# Altium footprint library SG__PCB_HOLE_Connector.PcbLib: 154 footprints (part 8 of 10)
Each footprint in its own frame and in the unit in brackets; x right, y up, seen from the top. Pads: shape width x height; smd on the part's side, far side on the other; paste and mask are expansions set on the pad; w line width, h text height; cw(c..) or ccw(c..) is an arc to the next point about the centre after c.
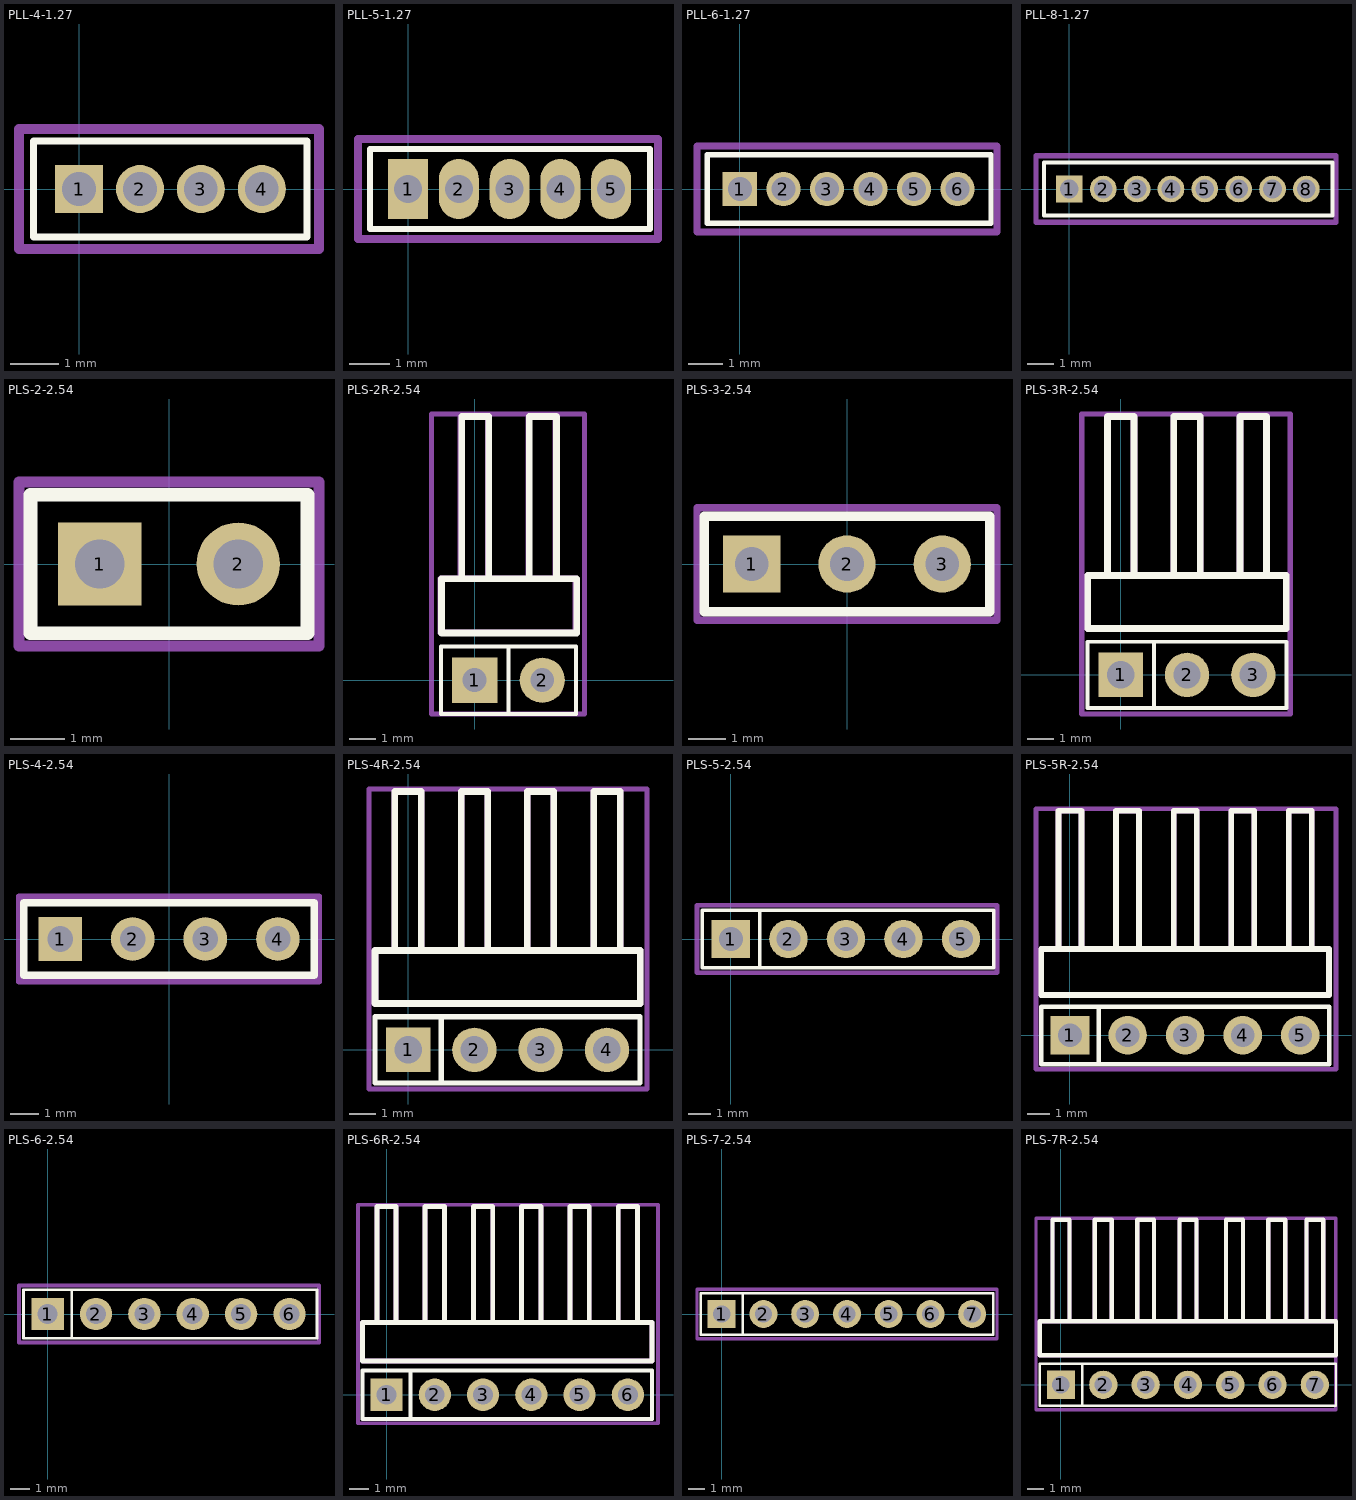
[diagram p7: the footprints below, top view; thin cyan lines are the x and y axes]

## PLL-4-1.27 [mm]
pads (4):
  rect 1x1 hole 0.7 mask+0.05: 1(0,0)
  round 1 hole 0.7 mask+0.05: 2(1.27,0) 3(2.54,0) 4(3.81,0)
Top Overlay:
  lines w0.15: -0.95,-1 4.75,-1 4.75,1 -0.95,1 -0.95,-1
Top Courtyard:
  lines w0.2: -1.25,-1.25 -1.25,1.25 5,1.25 5,-1.25 -1.25,-1.25

## PLL-5-1.27 [mm]
pads (5):
  rect 1x1.5 hole 0.7 mask+0.05: 1(0,0)
  oval 1x1.5 hole 0.7 mask+0.05: 2(1.27,0) 3(2.54,0) 4(3.81,0) 5(5.08,0)
Top Overlay:
  lines w0.15: -0.95,-1 -0.95,1 6.05,1 6.05,-1 -0.95,-1
Top Courtyard:
  lines w0.2: -1.25,-1.25 -1.25,1.25 6.25,1.25 6.25,-1.25 -1.25,-1.25

## PLL-6-1.27 [mm]
pads (6):
  rect 1x1 hole 0.7 mask+0.05: 1(0,0)
  round 1 hole 0.7 mask+0.05: 2(1.27,0) 3(2.54,0) 4(3.81,0) 5(5.08,0) 6(6.35,0)
Top Overlay:
  lines w0.15: -0.95,-1 7.32,-1 7.32,1 -0.95,1 -0.95,-1
Top Courtyard:
  lines w0.2: -1.25,-1.25 -1.25,1.25 7.5,1.25 7.5,-1.25 -1.25,-1.25

## PLL-8-1.27 [mm]
pads (8):
  rect 1x1 hole 0.7 mask+0.05: 1(0,0)
  round 1 hole 0.7 mask+0.05: 2(1.27,0) 3(2.54,0) 4(3.81,0) 5(5.08,0) 6(6.35,0) 7(7.62,0) 8(8.89,0)
Top Overlay:
  lines w0.15: -0.95,-1 9.86,-1 9.86,1 -0.95,1 -0.95,-1
Top Courtyard:
  lines w0.2: -1.25,-1.25 10,-1.25 10,1.25 -1.25,1.25 -1.25,-1.25

## PLS-2-2.54 [mil]
height 472.44
pads (2):
  rect 60x60 hole 35.43: 1(-50,0)
  round 60 hole 35.43: 2(50,0)
Top Overlay:
  lines w10: -100,-50 -100,50 100,50 100,-50 -100,-50
Top Courtyard:
  lines w7.87: -108.27,-59.06 -108.27,59.06 108.27,59.06 108.27,-59.06 -108.27,-59.06
3D body "PLS1.stp": height 336.22, standoff -118.11, extent -100,-50 0,50
3D body "PLS1.stp": height 336.22, standoff -118.11, extent 0,-50 100,50

## PLS-2R-2.54 [mm]
pads (2):
  rect 1.7x1.7 hole 0.9 mask+0.05: 1(0,0)
  round 1.7 hole 0.9 mask+0.05: 2(2.54,0)
Top Overlay:
  lines w0.15: 1.27,-1.27 1.27,1.27 ; -1.27,-1.27 -1.27,1.27 3.81,1.27 3.81,-1.27 -1.27,-1.27
  lines w0.254: -0.485,3.807 -0.485,9.903 0.531,9.903 0.531,3.807 ; 2.055,3.807 2.055,9.903 3.071,9.903 3.071,3.807 ; -1.247,1.775 3.833,1.775 3.833,3.807 -1.247,3.807 -1.247,1.775
Top Assembly:
  lines w0.254: -0.508,3.81 -0.508,9.906 0.508,9.906 0.508,3.81 ; 2.032,3.81 2.032,9.906 3.048,9.906 3.048,3.81 ; -1.27,1.778 3.81,1.778 3.81,3.81 -1.27,3.81 -1.27,1.778
Top Courtyard:
  lines w0.2: -1.619,-1.27 4.124,-1.27 4.124,10 -1.619,10 -1.619,-1.27
3D body "PLS-1R_D1.STEP": height 3, standoff -2.5, extent 1.27,-0.32 3.81,10.04
3D body "PLS-1R_D1.STEP": height 3, standoff -2.5, extent -1.27,-0.354 1.27,10.006

## PLS-3-2.54 [mil]
pads (3):
  rect 60x60 hole 35.43: 1(-100,0)
  round 60 hole 35.43: 2(0,0) 3(100,0)
Top Overlay:
  lines w10: -150,-50 -150,50 150,50 150,-50 -150,-50
Top Courtyard:
  lines w7.87: -157.48,-59.06 -157.48,59.06 157.48,59.06 157.48,-59.06 -157.48,-59.06
3D body "PLS1.stp": height 336.22, standoff -118.11, extent -150,-50 -50,50
3D body "PLS1.stp": height 336.22, standoff -118.11, extent -50,-50 50,50
3D body "PLS1.stp": height 336.22, standoff -118.11, extent 50,-50 150,50

## PLS-3R-2.54 [mm]
pads (3):
  rect 1.7x1.7 hole 1.05 mask+0.05: 1(0,0)
  round 1.7 hole 1.05 mask+0.05: 2(2.54,0) 3(5.08,0)
Top Overlay:
  lines w0.15: 1.27,-1.27 1.27,1.27 ; -1.27,-1.27 6.35,-1.27 6.35,1.27 -1.27,1.27 -1.27,-1.27
  lines w0.254: -0.508,3.81 -0.508,9.906 0.508,9.906 0.508,3.81 ; 2.032,3.81 2.032,9.906 3.048,9.906 3.048,3.81 ; 4.572,3.81 4.572,9.906 5.588,9.906 5.588,3.81 ; -1.27,1.778 -1.27,3.81 6.35,3.81 6.35,1.778 -1.27,1.778
Top Assembly:
  lines w0.254: -0.508,3.81 -0.508,9.906 0.508,9.906 0.508,3.81 ; 2.032,3.81 2.032,9.906 3.048,9.906 3.048,3.81 ; 4.572,3.81 4.572,9.906 5.588,9.906 5.588,3.81 ; -1.27,1.778 -1.27,3.81 6.35,3.81 6.35,1.778 -1.27,1.778
Top Courtyard:
  lines w0.2: -1.5,-1.5 6.5,-1.5 6.5,10 -1.5,10 -1.5,-1.5
3D body "PLS-1R_D1.STEP": height 3, standoff -2.5, extent -1.27,-0.354 1.27,10.006
3D body "PLS-1R_D1.STEP": height 3, standoff -2.5, extent 1.27,-0.32 3.81,10.04
3D body "PLS-1R_D1.STEP": height 3, standoff -2.5, extent 3.81,-0.32 6.35,10.04

## PLS-4-2.54 [mil]
pads (4):
  rect 60x60 hole 35.43: 1(-150,0)
  round 60 hole 35.43: 2(-50,0) 3(50,0) 4(150,0)
Top Overlay:
  lines w10: -200,-50 200,-50 200,50 -200,50 -200,-50
Top Courtyard:
  lines w7.87: -206.69,-59.06 -206.69,59.06 206.69,59.06 206.69,-59.06 -206.69,-59.06
3D body "PLS1.stp": height 336.22, standoff -118.11, extent 100,-50 200,50
3D body "PLS1.stp": height 336.22, standoff -118.11, extent 0,-50 100,50
3D body "PLS1.stp": height 336.22, standoff -118.11, extent -100,-50 0,50
3D body "PLS1.stp": height 336.22, standoff -118.11, extent -200,-50 -100,50

## PLS-4R-2.54 [mm]
pads (4):
  rect 1.7x1.7 hole 1.05 mask+0.05: 1(0,0)
  round 1.7 hole 1.05 mask+0.05: 2(2.54,0) 3(5.08,0) 4(7.62,0)
Top Overlay:
  lines w0.2: 1.27,-1.27 1.27,1.27 ; -1.27,-1.27 -1.27,1.27 8.89,1.27 8.89,-1.27 -1.27,-1.27
  lines w0.254: -0.508,3.81 -0.508,9.906 0.508,9.906 0.508,3.81 ; 2.032,3.81 2.032,9.906 3.048,9.906 3.048,3.81 ; 4.572,3.81 4.572,9.906 5.588,9.906 5.588,3.81 ; 7.112,3.81 7.112,9.906 8.128,9.906 8.128,3.81 ; -1.27,1.778 -1.27,3.81 8.89,3.81 8.89,1.778 -1.27,1.778
Top Assembly:
  lines w0.254: -0.508,3.81 -0.508,9.906 0.508,9.906 0.508,3.81 ; 2.032,3.81 2.032,9.906 3.048,9.906 3.048,3.81 ; 4.572,3.81 4.572,9.906 5.588,9.906 5.588,3.81 ; 7.112,3.81 7.112,9.906 8.128,9.906 8.128,3.81 ; -1.27,1.778 -1.27,3.81 8.89,3.81 8.89,1.778 -1.27,1.778
Top Courtyard:
  lines w0.2: -1.5,-1.5 -1.5,10 9.154,10 9.154,-1.5 -1.5,-1.5
3D body "PLS-1R_D1.STEP": height 3, standoff -2.5, extent 6.35,-0.32 8.89,10.04
3D body "PLS-1R_D1.STEP": height 3, standoff -2.5, extent 3.81,-0.32 6.35,10.04
3D body "PLS-1R_D1.STEP": height 3, standoff -2.5, extent 1.27,-0.32 3.81,10.04
3D body "PLS-1R_D1.STEP": height 3, standoff -2.5, extent -1.27,-0.354 1.27,10.006

## PLS-5-2.54 [mm]
pads (5):
  rect 1.7x1.7 hole 1.05 mask+0.05: 1(0,0)
  round 1.7 hole 1.05 mask+0.05: 2(2.54,0) 3(5.08,0) 4(7.62,0) 5(10.16,0)
Top Overlay:
  lines w0.15: 1.27,-1.27 1.27,1.27 ; -1.27,-1.27 11.6,-1.27 11.6,1.27 -1.27,1.27 -1.27,-1.27
Top Courtyard:
  lines w0.2: -1.5,-1.5 -1.5,1.5 11.75,1.5 11.75,-1.5 -1.5,-1.5
3D body "PLS1.stp": height 8.54, standoff -3, extent -1.27,-1.27 1.27,1.27
3D body "PLS1.stp": height 8.54, standoff -3, extent 1.27,-1.27 3.81,1.27
3D body "PLS1.stp": height 8.54, standoff -3, extent 3.81,-1.27 6.35,1.27
3D body "PLS1.stp": height 8.54, standoff -3, extent 6.35,-1.27 8.89,1.27
3D body "PLS1.stp": height 8.54, standoff -3, extent 8.89,-1.27 11.43,1.27

## PLS-5R-2.54 [mm]
pads (5):
  rect 1.7x1.7 hole 1.05 mask+0.05: 1(0,0)
  round 1.7 hole 1.05 mask+0.05: 2(2.54,0) 3(5.08,0) 4(7.62,0) 5(10.16,0)
Top Overlay:
  lines w0.2: 1.27,-1.27 1.27,1.27 ; -1.27,-1.27 -1.27,1.27 11.43,1.27 11.43,-1.27 -1.27,-1.27
  lines w0.254: -0.508,3.81 -0.508,9.906 0.508,9.906 0.508,3.81 ; 2.032,3.81 2.032,9.906 3.048,9.906 3.048,3.81 ; 4.572,3.81 4.572,9.906 5.588,9.906 5.588,3.81 ; 7.112,3.81 7.112,9.906 8.128,9.906 8.128,3.81 ; 9.652,3.81 9.652,9.906 10.668,9.906 10.668,3.81 ; -1.27,1.778 -1.27,3.81 11.43,3.81 11.43,1.778 -1.27,1.778
Top Assembly:
  lines w0.254: -0.508,3.81 -0.508,9.906 0.508,9.906 0.508,3.81 ; 2.032,3.81 2.032,9.906 3.048,9.906 3.048,3.81 ; 4.572,3.81 4.572,9.906 5.588,9.906 5.588,3.81 ; 7.112,3.81 7.112,9.906 8.128,9.906 8.128,3.81 ; 9.652,3.81 9.652,9.906 10.668,9.906 10.668,3.81 ; -1.27,1.778 -1.27,3.81 11.43,3.81 11.43,1.778 -1.27,1.778
Top Courtyard:
  lines w0.2: -1.5,-1.5 11.736,-1.5 11.736,10 -1.5,10 -1.5,-1.5
3D body "PLS-1R_D1.STEP": height 3, standoff -2.5, extent -1.27,-0.354 1.27,10.006
3D body "PLS-1R_D1.STEP": height 3, standoff -2.5, extent 1.27,-0.32 3.81,10.04
3D body "PLS-1R_D1.STEP": height 3, standoff -2.5, extent 3.81,-0.32 6.35,10.04
3D body "PLS-1R_D1.STEP": height 3, standoff -2.5, extent 6.35,-0.32 8.89,10.04
3D body "PLS-1R_D1.STEP": height 3, standoff -2.5, extent 8.89,-0.32 11.43,10.04

## PLS-6-2.54 [mm]
pads (6):
  rect 1.7x1.7 hole 1.05 mask+0.05: 1(0,0)
  round 1.7 hole 1.05 mask+0.05: 2(2.54,0) 3(5.08,0) 4(7.62,0) 5(10.16,0) 6(12.7,0)
Top Overlay:
  lines w0.15: 1.27,-1.27 1.27,1.27 ; -1.27,-1.27 -1.27,1.27 14.14,1.27 14.14,-1.27 -1.27,-1.27
Top Courtyard:
  lines w0.2: -1.5,-1.5 14.25,-1.5 14.25,1.5 -1.5,1.5 -1.5,-1.5
3D body "PLS1.stp": height 8.54, standoff -3, extent 1.27,-1.27 3.81,1.27
3D body "PLS1.stp": height 8.54, standoff -3, extent -1.27,-1.27 1.27,1.27
3D body "PLS1.stp": height 8.54, standoff -3, extent 11.43,-1.27 13.97,1.27
3D body "PLS1.stp": height 8.54, standoff -3, extent 8.89,-1.27 11.43,1.27
3D body "PLS1.stp": height 8.54, standoff -3, extent 6.35,-1.27 8.89,1.27
3D body "PLS1.stp": height 8.54, standoff -3, extent 3.81,-1.27 6.35,1.27

## PLS-6R-2.54 [mm]
pads (6):
  rect 1.7x1.7 hole 1.05 mask+0.05: 1(0,0)
  round 1.7 hole 1.05 mask+0.05: 2(2.54,0) 3(5.08,0) 4(7.62,0) 5(10.16,0) 6(12.7,0)
Top Overlay:
  lines w0.2: 1.27,-1.27 1.27,1.27 ; -1.27,-1.27 13.97,-1.27 13.97,1.27 -1.27,1.27 -1.27,-1.27
  lines w0.254: -0.508,3.81 -0.508,9.906 0.508,9.906 0.508,3.81 ; 2.032,3.81 2.032,9.906 3.048,9.906 3.048,3.81 ; 4.572,3.81 4.572,9.906 5.588,9.906 5.588,3.81 ; 7.112,3.81 7.112,9.906 8.128,9.906 8.128,3.81 ; 9.652,3.81 9.652,9.906 10.668,9.906 10.668,3.81 ; 12.192,3.81 12.192,9.906 13.208,9.906 13.208,3.81 ; -1.27,1.778 13.97,1.778 13.97,3.81 -1.27,3.81 -1.27,1.778
Top Assembly:
  lines w0.254: -0.508,3.81 -0.508,9.906 0.508,9.906 0.508,3.81 ; 2.032,3.81 2.032,9.906 3.048,9.906 3.048,3.81 ; 4.572,3.81 4.572,9.906 5.588,9.906 5.588,3.81 ; 7.112,3.81 7.112,9.906 8.128,9.906 8.128,3.81 ; 9.652,3.81 9.652,9.906 10.668,9.906 10.668,3.81 ; 12.192,3.81 12.192,9.906 13.208,9.906 13.208,3.81 ; -1.27,1.778 -1.27,3.81 13.97,3.81 13.97,1.778 -1.27,1.778
Top Courtyard:
  lines w0.2: -1.5,-1.5 -1.5,10 14.288,10 14.288,-1.5 -1.5,-1.5
3D body "PLS-1R_D1.STEP": height 3, standoff -2.5, extent 11.43,-0.32 13.97,10.04
3D body "PLS-1R_D1.STEP": height 3, standoff -2.5, extent 8.89,-0.32 11.43,10.04
3D body "PLS-1R_D1.STEP": height 3, standoff -2.5, extent 6.35,-0.32 8.89,10.04
3D body "PLS-1R_D1.STEP": height 3, standoff -2.5, extent 3.81,-0.32 6.35,10.04
3D body "PLS-1R_D1.STEP": height 3, standoff -2.5, extent 1.27,-0.32 3.81,10.04
3D body "PLS-1R_D1.STEP": height 3, standoff -2.5, extent -1.27,-0.354 1.27,10.006

## PLS-7-2.54 [mm]
pads (7):
  rect 1.7x1.7 hole 1.05 mask+0.05: 1(0,0)
  round 1.7 hole 1.05 mask+0.05: 2(2.54,0) 3(5.08,0) 4(7.62,0) 5(10.16,0) 6(12.7,0) 7(15.24,0)
Top Overlay:
  lines w0.15: 1.27,-1.27 1.27,1.27 ; -1.27,-1.27 -1.27,1.27 16.51,1.27 16.51,-1.27 -1.27,-1.27
Top Courtyard:
  lines w0.2: -1.5,-1.5 16.75,-1.5 16.75,1.5 -1.5,1.5 -1.5,-1.5
3D body "PLS1.stp": height 8.54, standoff -3, extent -1.27,-1.27 1.27,1.27
3D body "PLS1.stp": height 8.54, standoff -3, extent 1.27,-1.27 3.81,1.27
3D body "PLS1.stp": height 8.54, standoff -3, extent 3.81,-1.27 6.35,1.27
3D body "PLS1.stp": height 8.54, standoff -3, extent 6.35,-1.27 8.89,1.27
3D body "PLS1.stp": height 8.54, standoff -3, extent 8.89,-1.27 11.43,1.27
3D body "PLS1.stp": height 8.54, standoff -3, extent 11.43,-1.27 13.97,1.27
3D body "PLS1.stp": height 8.54, standoff -3, extent 13.97,-1.27 16.51,1.27

## PLS-7R-2.54 [mm]
pads (7):
  rect 1.7x1.7 hole 1.05 mask+0.05: 1(0,0)
  round 1.7 hole 1.05 mask+0.05: 2(2.54,0) 3(5.08,0) 4(7.62,0) 5(10.16,0) 6(12.7,0) 7(15.24,0)
Top Overlay:
  lines w0.15: 1.27,-1.27 1.27,1.27 ; -1.27,-1.27 -1.27,1.27 16.51,1.27 16.51,-1.27 -1.27,-1.27
  lines w0.254: -0.508,3.81 -0.508,9.906 0.508,9.906 0.508,3.81 ; 2.032,3.81 2.032,9.906 3.048,9.906 3.048,3.81 ; 4.572,3.81 4.572,9.906 5.588,9.906 5.588,3.81 ; 7.112,3.81 7.112,9.906 8.128,9.906 8.128,3.81 ; 9.906,3.81 9.906,9.906 10.922,9.906 10.922,3.81 ; 12.446,3.81 12.446,9.906 13.462,9.906 13.462,3.81 ; 14.732,3.81 14.732,9.906 15.748,9.906 15.748,3.81 ; -1.27,1.778 16.51,1.778 16.51,3.81 -1.27,3.81 -1.27,1.778
Top Assembly:
  lines w0.254: -0.508,3.81 -0.508,9.906 0.508,9.906 0.508,3.81 ; 2.032,3.81 2.032,9.906 3.048,9.906 3.048,3.81 ; 4.572,3.81 4.572,9.906 5.588,9.906 5.588,3.81 ; 7.112,3.81 7.112,9.906 8.128,9.906 8.128,3.81 ; 9.906,3.81 9.906,9.906 10.922,9.906 10.922,3.81 ; 12.446,3.81 12.446,9.906 13.462,9.906 13.462,3.81 ; 14.732,3.81 14.732,9.906 15.748,9.906 15.748,3.81 ; -1.27,1.778 16.51,1.778 16.51,3.81 -1.27,3.81 -1.27,1.778
Top Courtyard:
  lines w0.2: -1.5,-1.5 16.5,-1.5 16.5,10 -1.5,10 -1.5,-1.5
3D body "PLS-1R_D1.STEP": height 3, standoff -2.5, extent 13.97,-0.32 16.51,10.04
3D body "PLS-1R_D1.STEP": height 3, standoff -2.5, extent 11.43,-0.32 13.97,10.04
3D body "PLS-1R_D1.STEP": height 3, standoff -2.5, extent 8.89,-0.32 11.43,10.04
3D body "PLS-1R_D1.STEP": height 3, standoff -2.5, extent 6.35,-0.32 8.89,10.04
3D body "PLS-1R_D1.STEP": height 3, standoff -2.5, extent 3.81,-0.32 6.35,10.04
3D body "PLS-1R_D1.STEP": height 3, standoff -2.5, extent 1.27,-0.32 3.81,10.04
3D body "PLS-1R_D1.STEP": height 3, standoff -2.5, extent -1.27,-0.354 1.27,10.006